# Altium integrated library WCAP-ATG8_rev15a.intlib: 195 symbols (part 1 of 2) (continued)
## WCAP-ATG8 10x12.5x5x0.6 860010375015
designator C?, comment 680 μF
WCAP-ATG8 Aluminum Electrolytic Capacitors , 680 μF; + / - 20%; 16 V , 10 x 12,5; Manufacturer: Wurth Elektronik; partNo: 860010375015; E-mail: libraries@we-online.com; Characteristics: Aluminum Electrolytic Capacitor; Recommended soldering: Wave; Operating temperature:–40 °C to +85 °C for UR < 400 V; 25 °C to +85 °C for UR ≥ 400 V; Wide capacitance value range; Load life: 2000 h @ +85 °C; ComponentLink1Description: Manufacturer; ComponentLink1URL: http://www.we-online.com; ComponentLink2Description: Datasheet; ComponentLink2URL: http://katalog.we-online.de/pbs/datasheet/860010375015.pdf; Created by: Karrer Zheng; Created Date: 6/8/2015; Capacitance: 680 μF; Application: Medium and high voltage type range from 160V-450V used as primary side input filter in power supply; Low voltage type used as energy storage or low frequency filtering in circuit, applied to general switching power supply, AC-DC converter, adapter, charger, TV, VCR, DC motor circuit filter, digital audio, digital cameras, digital video cameras, satellite receiver etc.
footprint WCAP-ATG8 10x12.5x5x0.6
pins: 1, 2

## WCAP-ATG8 10x16x5x0.6 860010375016
designator C?, comment 820 μF
WCAP-ATG8 Aluminum Electrolytic Capacitors , 820 μF; + / - 20%; 16 V , 10 x 16; Manufacturer: Wurth Elektronik; partNo: 860010375016; E-mail: libraries@we-online.com; Characteristics: Aluminum Electrolytic Capacitor; Recommended soldering: Wave; Operating temperature:–40 °C to +85 °C for UR < 400 V; 25 °C to +85 °C for UR ≥ 400 V; Wide capacitance value range; Load life: 2000 h @ +85 °C; ComponentLink1Description: Manufacturer; ComponentLink1URL: http://www.we-online.com; ComponentLink2Description: Datasheet; ComponentLink2URL: http://katalog.we-online.de/pbs/datasheet/860010375016.pdf; Created by: Karrer Zheng; Created Date: 6/8/2015; Capacitance: 820 μF; Application: Medium and high voltage type range from 160V-450V used as primary side input filter in power supply; Low voltage type used as energy storage or low frequency filtering in circuit, applied to general switching power supply, AC-DC converter, adapter, charger, TV, VCR, DC motor circuit filter, digital audio, digital cameras, digital video cameras, satellite receiver etc.
footprint WCAP-ATG8 10x16x5x0.6
pins: 1, 2

## WCAP-ATG8 10x16x5x0.6 860010375017
designator C?, comment 1000 μF
WCAP-ATG8 Aluminum Electrolytic Capacitors , 1000 μF; + / - 20%; 16 V , 10 x 16; Manufacturer: Wurth Elektronik; partNo: 860010375017; E-mail: libraries@we-online.com; Characteristics: Aluminum Electrolytic Capacitor; Recommended soldering: Wave; Operating temperature:–40 °C to +85 °C for UR < 400 V; 25 °C to +85 °C for UR ≥ 400 V; Wide capacitance value range; Load life: 2000 h @ +85 °C; ComponentLink1Description: Manufacturer; ComponentLink1URL: http://www.we-online.com; ComponentLink2Description: Datasheet; ComponentLink2URL: http://katalog.we-online.de/pbs/datasheet/860010375017.pdf; Created by: Karrer Zheng; Created Date: 6/8/2015; Capacitance: 1000 μF; Application: Medium and high voltage type range from 160V-450V used as primary side input filter in power supply; Low voltage type used as energy storage or low frequency filtering in circuit, applied to general switching power supply, AC-DC converter, adapter, charger, TV, VCR, DC motor circuit filter, digital audio, digital cameras, digital video cameras, satellite receiver etc.
footprint WCAP-ATG8 10x16x5x0.6
pins: 1, 2

## WCAP-ATG8 10x16x5x0.6 860010375018
designator C?, comment 1200 μF
WCAP-ATG8 Aluminum Electrolytic Capacitors , 1200 μF; + / - 20%; 16 V , 10 x 16; Manufacturer: Wurth Elektronik; partNo: 860010375018; E-mail: libraries@we-online.com; Characteristics: Aluminum Electrolytic Capacitor; Recommended soldering: Wave; Operating temperature:–40 °C to +85 °C for UR < 400 V; 25 °C to +85 °C for UR ≥ 400 V; Wide capacitance value range; Load life: 2000 h @ +85 °C; ComponentLink1Description: Manufacturer; ComponentLink1URL: http://www.we-online.com; ComponentLink2Description: Datasheet; ComponentLink2URL: http://katalog.we-online.de/pbs/datasheet/860010375018.pdf; Created by: Karrer Zheng; Created Date: 6/8/2015; Capacitance: 1200 μF; Application: Medium and high voltage type range from 160V-450V used as primary side input filter in power supply; Low voltage type used as energy storage or low frequency filtering in circuit, applied to general switching power supply, AC-DC converter, adapter, charger, TV, VCR, DC motor circuit filter, digital audio, digital cameras, digital video cameras, satellite receiver etc.
footprint WCAP-ATG8 10x16x5x0.6
pins: 1, 2

## WCAP-ATG8 10x20x5x0.6 860010375019
designator C?, comment 1500 μF
WCAP-ATG8 Aluminum Electrolytic Capacitors , 1500 μF; + / - 20%; 16 V , 10 x 20; Manufacturer: Wurth Elektronik; partNo: 860010375019; E-mail: libraries@we-online.com; Characteristics: Aluminum Electrolytic Capacitor; Recommended soldering: Wave; Operating temperature:–40 °C to +85 °C for UR < 400 V; 25 °C to +85 °C for UR ≥ 400 V; Wide capacitance value range; Load life: 2000 h @ +85 °C; ComponentLink1Description: Manufacturer; ComponentLink1URL: http://www.we-online.com; ComponentLink2Description: Datasheet; ComponentLink2URL: http://katalog.we-online.de/pbs/datasheet/860010375019.pdf; Created by: Karrer Zheng; Created Date: 6/8/2015; Capacitance: 1500 μF; Application: Medium and high voltage type range from 160V-450V used as primary side input filter in power supply; Low voltage type used as energy storage or low frequency filtering in circuit, applied to general switching power supply, AC-DC converter, adapter, charger, TV, VCR, DC motor circuit filter, digital audio, digital cameras, digital video cameras, satellite receiver etc.
footprint WCAP-ATG8 10x20x5x0.6
pins: 1, 2

## WCAP-ATG8 13x20x5x0.6 860010378020
designator C?, comment 1800 μF
WCAP-ATG8 Aluminum Electrolytic Capacitors , 1800 μF; + / - 20%; 16 V , 13 x 20; Manufacturer: Wurth Elektronik; partNo: 860010378020; E-mail: libraries@we-online.com; Characteristics: Aluminum Electrolytic Capacitor; Recommended soldering: Wave; Operating temperature:–40 °C to +85 °C for UR < 400 V; 25 °C to +85 °C for UR ≥ 400 V; Wide capacitance value range; Load life: 2000 h @ +85 °C; ComponentLink1Description: Manufacturer; ComponentLink1URL: http://www.we-online.com; ComponentLink2Description: Datasheet; ComponentLink2URL: http://katalog.we-online.de/pbs/datasheet/860010378020.pdf; Created by: Karrer Zheng; Created Date: 6/8/2015; Capacitance: 1800 μF; Application: Medium and high voltage type range from 160V-450V used as primary side input filter in power supply; Low voltage type used as energy storage or low frequency filtering in circuit, applied to general switching power supply, AC-DC converter, adapter, charger, TV, VCR, DC motor circuit filter, digital audio, digital cameras, digital video cameras, satellite receiver etc.
footprint WCAP-ATG8 13x20x5x0.6
pins: 1, 2

## WCAP-ATG8 13x20x5x0.6 860010378021
designator C?, comment 2200 μF
WCAP-ATG8 Aluminum Electrolytic Capacitors , 2200 μF; + / - 20%; 16 V , 13 x 20; Manufacturer: Wurth Elektronik; partNo: 860010378021; E-mail: libraries@we-online.com; Characteristics: Aluminum Electrolytic Capacitor; Recommended soldering: Wave; Operating temperature:–40 °C to +85 °C for UR < 400 V; 25 °C to +85 °C for UR ≥ 400 V; Wide capacitance value range; Load life: 2000 h @ +85 °C; ComponentLink1Description: Manufacturer; ComponentLink1URL: http://www.we-online.com; ComponentLink2Description: Datasheet; ComponentLink2URL: http://katalog.we-online.de/pbs/datasheet/860010378021.pdf; Created by: Karrer Zheng; Created Date: 6/8/2015; Capacitance: 2200 μF; Application: Medium and high voltage type range from 160V-450V used as primary side input filter in power supply; Low voltage type used as energy storage or low frequency filtering in circuit, applied to general switching power supply, AC-DC converter, adapter, charger, TV, VCR, DC motor circuit filter, digital audio, digital cameras, digital video cameras, satellite receiver etc.
footprint WCAP-ATG8 13x20x5x0.6
pins: 1, 2

## WCAP-ATG8 13x20x5x0.6 860010378022
designator C?, comment 2700 μF
WCAP-ATG8 Aluminum Electrolytic Capacitors , 2700 μF; + / - 20%; 16 V , 13 x 20; Manufacturer: Wurth Elektronik; partNo: 860010378022; E-mail: libraries@we-online.com; Characteristics: Aluminum Electrolytic Capacitor; Recommended soldering: Wave; Operating temperature:–40 °C to +85 °C for UR < 400 V; 25 °C to +85 °C for UR ≥ 400 V; Wide capacitance value range; Load life: 2000 h @ +85 °C; ComponentLink1Description: Manufacturer; ComponentLink1URL: http://www.we-online.com; ComponentLink2Description: Datasheet; ComponentLink2URL: http://katalog.we-online.de/pbs/datasheet/860010378022.pdf; Created by: Karrer Zheng; Created Date: 6/8/2015; Capacitance: 2700 μF; Application: Medium and high voltage type range from 160V-450V used as primary side input filter in power supply; Low voltage type used as energy storage or low frequency filtering in circuit, applied to general switching power supply, AC-DC converter, adapter, charger, TV, VCR, DC motor circuit filter, digital audio, digital cameras, digital video cameras, satellite receiver etc.
footprint WCAP-ATG8 13x20x5x0.6
pins: 1, 2

## WCAP-ATG8 13x20x5x0.6 860010378023
designator C?, comment 3300 μF
WCAP-ATG8 Aluminum Electrolytic Capacitors , 3300 μF; + / - 20%; 16 V , 13 x 20; Manufacturer: Wurth Elektronik; partNo: 860010378023; E-mail: libraries@we-online.com; Characteristics: Aluminum Electrolytic Capacitor; Recommended soldering: Wave; Operating temperature:–40 °C to +85 °C for UR < 400 V; 25 °C to +85 °C for UR ≥ 400 V; Wide capacitance value range; Load life: 2000 h @ +85 °C; ComponentLink1Description: Manufacturer; ComponentLink1URL: http://www.we-online.com; ComponentLink2Description: Datasheet; ComponentLink2URL: http://katalog.we-online.de/pbs/datasheet/860010378023.pdf; Created by: Karrer Zheng; Created Date: 6/8/2015; Capacitance: 3300 μF; Application: Medium and high voltage type range from 160V-450V used as primary side input filter in power supply; Low voltage type used as energy storage or low frequency filtering in circuit, applied to general switching power supply, AC-DC converter, adapter, charger, TV, VCR, DC motor circuit filter, digital audio, digital cameras, digital video cameras, satellite receiver etc.
footprint WCAP-ATG8 13x20x5x0.6
pins: 1, 2

## WCAP-ATG8 16x25x7.5x0.8 860010380024
designator C?, comment 3900 μF
WCAP-ATG8 Aluminum Electrolytic Capacitors , 3900 μF; + / - 20%; 16 V , 16 x 25; Manufacturer: Wurth Elektronik; partNo: 860010380024; E-mail: libraries@we-online.com; Characteristics: Aluminum Electrolytic Capacitor; Recommended soldering: Wave; Operating temperature:–40 °C to +85 °C for UR < 400 V; 25 °C to +85 °C for UR ≥ 400 V; Wide capacitance value range; Load life: 2000 h @ +85 °C; ComponentLink1Description: Manufacturer; ComponentLink1URL: http://www.we-online.com; ComponentLink2Description: Datasheet; ComponentLink2URL: http://katalog.we-online.de/pbs/datasheet/860010380024.pdf; Created by: Karrer Zheng; Created Date: 6/8/2015; Capacitance: 3900 μF; Application: Medium and high voltage type range from 160V-450V used as primary side input filter in power supply; Low voltage type used as energy storage or low frequency filtering in circuit, applied to general switching power supply, AC-DC converter, adapter, charger, TV, VCR, DC motor circuit filter, digital audio, digital cameras, digital video cameras, satellite receiver etc.
footprint WCAP-ATG8 16x25x7.5x0.8
pins: 1, 2

## WCAP-ATG8 16x25x7.5x0.8 860010380025
designator C?, comment 4700 μF
WCAP-ATG8 Aluminum Electrolytic Capacitors , 4700 μF; + / - 20%; 16 V , 16 x 25; Manufacturer: Wurth Elektronik; partNo: 860010380025; E-mail: libraries@we-online.com; Characteristics: Aluminum Electrolytic Capacitor; Recommended soldering: Wave; Operating temperature:–40 °C to +85 °C for UR < 400 V; 25 °C to +85 °C for UR ≥ 400 V; Wide capacitance value range; Load life: 2000 h @ +85 °C; ComponentLink1Description: Manufacturer; ComponentLink1URL: http://www.we-online.com; ComponentLink2Description: Datasheet; ComponentLink2URL: http://katalog.we-online.de/pbs/datasheet/860010380025.pdf; Created by: Karrer Zheng; Created Date: 6/8/2015; Capacitance: 4700 μF; Application: Medium and high voltage type range from 160V-450V used as primary side input filter in power supply; Low voltage type used as energy storage or low frequency filtering in circuit, applied to general switching power supply, AC-DC converter, adapter, charger, TV, VCR, DC motor circuit filter, digital audio, digital cameras, digital video cameras, satellite receiver etc.
footprint WCAP-ATG8 16x25x7.5x0.8
pins: 1, 2

## WCAP-ATG8 16x31.5x7.5x0.8 860010380026
designator C?, comment 5600 μF
WCAP-ATG8 Aluminum Electrolytic Capacitors , 5600 μF; + / - 20%; 16 V , 16 x 31,5; Manufacturer: Wurth Elektronik; partNo: 860010380026; E-mail: libraries@we-online.com; Characteristics: Aluminum Electrolytic Capacitor; Recommended soldering: Wave; Operating temperature:–40 °C to +85 °C for UR < 400 V; 25 °C to +85 °C for UR ≥ 400 V; Wide capacitance value range; Load life: 2000 h @ +85 °C; ComponentLink1Description: Manufacturer; ComponentLink1URL: http://www.we-online.com; ComponentLink2Description: Datasheet; ComponentLink2URL: http://katalog.we-online.de/pbs/datasheet/860010380026.pdf; Created by: Karrer Zheng; Created Date: 6/8/2015; Capacitance: 5600 μF; Application: Medium and high voltage type range from 160V-450V used as primary side input filter in power supply; Low voltage type used as energy storage or low frequency filtering in circuit, applied to general switching power supply, AC-DC converter, adapter, charger, TV, VCR, DC motor circuit filter, digital audio, digital cameras, digital video cameras, satellite receiver etc.
footprint WCAP-ATG8 16x31.5x7.5x0.8
pins: 1, 2

## WCAP-ATG8 16x31.5x7.5x0.8 860010380027
designator C?, comment 6800 μF
WCAP-ATG8 Aluminum Electrolytic Capacitors , 6800 μF; + / - 20%; 16 V , 16 x 31,5; Manufacturer: Wurth Elektronik; partNo: 860010380027; E-mail: libraries@we-online.com; Characteristics: Aluminum Electrolytic Capacitor; Recommended soldering: Wave; Operating temperature:–40 °C to +85 °C for UR < 400 V; 25 °C to +85 °C for UR ≥ 400 V; Wide capacitance value range; Load life: 2000 h @ +85 °C; ComponentLink1Description: Manufacturer; ComponentLink1URL: http://www.we-online.com; ComponentLink2Description: Datasheet; ComponentLink2URL: http://katalog.we-online.de/pbs/datasheet/860010380027.pdf; Created by: Karrer Zheng; Created Date: 6/8/2015; Capacitance: 6800 μF; Application: Medium and high voltage type range from 160V-450V used as primary side input filter in power supply; Low voltage type used as energy storage or low frequency filtering in circuit, applied to general switching power supply, AC-DC converter, adapter, charger, TV, VCR, DC motor circuit filter, digital audio, digital cameras, digital video cameras, satellite receiver etc.
footprint WCAP-ATG8 16x31.5x7.5x0.8
pins: 1, 2

## WCAP-ATG8 16x35.5x7.5x0.8 860010380028
designator C?, comment 8200 μF
WCAP-ATG8 Aluminum Electrolytic Capacitors , 8200 μF; + / - 20%; 16 V , 16 x 35,5; Manufacturer: Wurth Elektronik; partNo: 860010380028; E-mail: libraries@we-online.com; Characteristics: Aluminum Electrolytic Capacitor; Recommended soldering: Wave; Operating temperature:–40 °C to +85 °C for UR < 400 V; 25 °C to +85 °C for UR ≥ 400 V; Wide capacitance value range; Load life: 2000 h @ +85 °C; ComponentLink1Description: Manufacturer; ComponentLink1URL: http://www.we-online.com; ComponentLink2Description: Datasheet; ComponentLink2URL: http://katalog.we-online.de/pbs/datasheet/860010380028.pdf; Created by: Karrer Zheng; Created Date: 6/8/2015; Capacitance: 8200 μF; Application: Medium and high voltage type range from 160V-450V used as primary side input filter in power supply; Low voltage type used as energy storage or low frequency filtering in circuit, applied to general switching power supply, AC-DC converter, adapter, charger, TV, VCR, DC motor circuit filter, digital audio, digital cameras, digital video cameras, satellite receiver etc.
footprint WCAP-ATG8 16x35.5x7.5x0.8
pins: 1, 2

## WCAP-ATG8 18x35.5x7.5x0.8 860010381029
designator C?, comment 10000 μF
WCAP-ATG8 Aluminum Electrolytic Capacitors , 10000 μF; + / - 20%; 16 V , 18 x 35,5; Manufacturer: Wurth Elektronik; partNo: 860010381029; E-mail: libraries@we-online.com; Characteristics: Aluminum Electrolytic Capacitor; Recommended soldering: Wave; Operating temperature:–40 °C to +85 °C for UR < 400 V; 25 °C to +85 °C for UR ≥ 400 V; Wide capacitance value range; Load life: 2000 h @ +85 °C; ComponentLink1Description: Manufacturer; ComponentLink1URL: http://www.we-online.com; ComponentLink2Description: Datasheet; ComponentLink2URL: http://katalog.we-online.de/pbs/datasheet/860010381029.pdf; Created by: Karrer Zheng; Created Date: 6/8/2015; Capacitance: 10000 μF; Application: Medium and high voltage type range from 160V-450V used as primary side input filter in power supply; Low voltage type used as energy storage or low frequency filtering in circuit, applied to general switching power supply, AC-DC converter, adapter, charger, TV, VCR, DC motor circuit filter, digital audio, digital cameras, digital video cameras, satellite receiver etc.
footprint WCAP-ATG8 18x35.5x7.5x0.8
pins: 1, 2

## WCAP-ATG8 18x35.5x7.5x0.8 860010381030
designator C?, comment 12000 μF
WCAP-ATG8 Aluminum Electrolytic Capacitors , 12000 μF; + / - 20%; 16 V , 18 x 35,5; Manufacturer: Wurth Elektronik; partNo: 860010381030; E-mail: libraries@we-online.com; Characteristics: Aluminum Electrolytic Capacitor; Recommended soldering: Wave; Operating temperature:–40 °C to +85 °C for UR < 400 V; 25 °C to +85 °C for UR ≥ 400 V; Wide capacitance value range; Load life: 2000 h @ +85 °C; ComponentLink1Description: Manufacturer; ComponentLink1URL: http://www.we-online.com; ComponentLink2Description: Datasheet; ComponentLink2URL: http://katalog.we-online.de/pbs/datasheet/860010381030.pdf; Created by: Karrer Zheng; Created Date: 6/8/2015; Capacitance: 12000 μF; Application: Medium and high voltage type range from 160V-450V used as primary side input filter in power supply; Low voltage type used as energy storage or low frequency filtering in circuit, applied to general switching power supply, AC-DC converter, adapter, charger, TV, VCR, DC motor circuit filter, digital audio, digital cameras, digital video cameras, satellite receiver etc.
footprint WCAP-ATG8 18x35.5x7.5x0.8
pins: 1, 2

## WCAP-ATG8 22x41x10x0.8 860010383031
designator C?, comment 15000 μF
WCAP-ATG8 Aluminum Electrolytic Capacitors , 15000 μF; + / - 20%; 16 V , 22 x 41; Manufacturer: Wurth Elektronik; partNo: 860010383031; E-mail: libraries@we-online.com; Characteristics: Aluminum Electrolytic Capacitor; Recommended soldering: Wave; Operating temperature:–40 °C to +85 °C for UR < 400 V; 25 °C to +85 °C for UR ≥ 400 V; Wide capacitance value range; Load life: 2000 h @ +85 °C; ComponentLink1Description: Manufacturer; ComponentLink1URL: http://www.we-online.com; ComponentLink2Description: Datasheet; ComponentLink2URL: http://katalog.we-online.de/pbs/datasheet/860010383031.pdf; Created by: Karrer Zheng; Created Date: 6/8/2015; Capacitance: 15000 μF; Application: Medium and high voltage type range from 160V-450V used as primary side input filter in power supply; Low voltage type used as energy storage or low frequency filtering in circuit, applied to general switching power supply, AC-DC converter, adapter, charger, TV, VCR, DC motor circuit filter, digital audio, digital cameras, digital video cameras, satellite receiver etc.
footprint WCAP-ATG8 22x41x10x0.8
pins: 1, 2


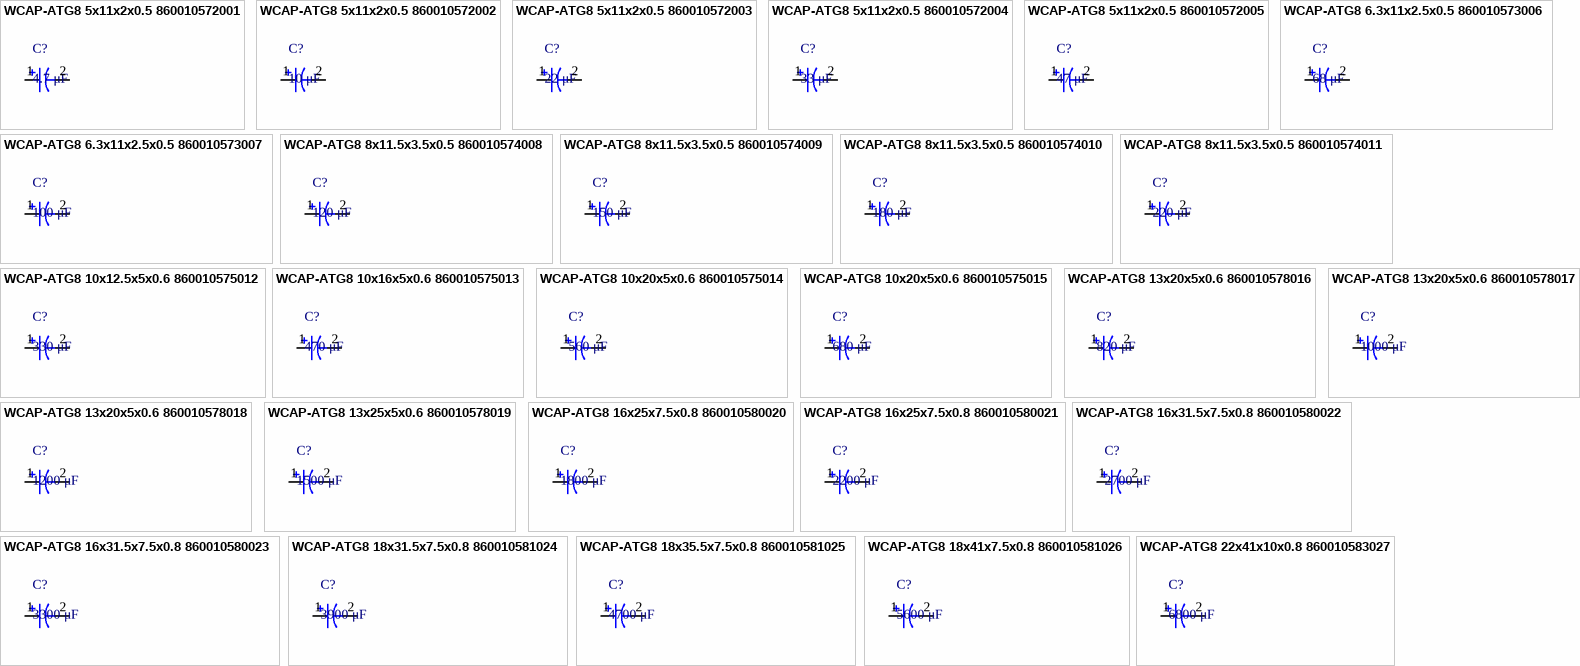
[diagram p2: symbols WCAP-ATG8 5x11x2x0.5 860010572001 to WCAP-ATG8 22x41x10x0.8 860010583027]

## WCAP-ATG8 5x11x2x0.5 860010572001
designator C?, comment 4.7 μF
WCAP-ATG8 Aluminum Electrolytic Capacitors , 4,7 μF; + / - 20%; 35 V , 5 x 11; Manufacturer: Wurth Elektronik; partNo: 860010572001; E-mail: libraries@we-online.com; Characteristics: Aluminum Electrolytic Capacitor; Recommended soldering: Wave; Operating temperature:–40 °C to +85 °C for UR < 400 V; 25 °C to +85 °C for UR ≥ 400 V; Wide capacitance value range; Load life: 2000 h @ +85 °C; ComponentLink1Description: Manufacturer; ComponentLink1URL: http://www.we-online.com; ComponentLink2Description: Datasheet; ComponentLink2URL: http://katalog.we-online.de/pbs/datasheet/860010572001.pdf; Created by: Karrer Zheng; Created Date: 6/8/2015; Capacitance: 4.7 μF; Application: Medium and high voltage type range from 160V-450V used as primary side input filter in power supply; Low voltage type used as energy storage or low frequency filtering in circuit, applied to general switching power supply, AC-DC converter, adapter, charger, TV, VCR, DC motor circuit filter, digital audio, digital cameras, digital video cameras, satellite receiver etc.
footprint WCAP-ATG8 5x11x2x0.5
pins: 1, 2

## WCAP-ATG8 5x11x2x0.5 860010572002
designator C?, comment 10 μF
WCAP-ATG8 Aluminum Electrolytic Capacitors , 10 μF; + / - 20%; 35 V , 5 x 11; Manufacturer: Wurth Elektronik; partNo: 860010572002; E-mail: libraries@we-online.com; Characteristics: Aluminum Electrolytic Capacitor; Recommended soldering: Wave; Operating temperature:–40 °C to +85 °C for UR < 400 V; 25 °C to +85 °C for UR ≥ 400 V; Wide capacitance value range; Load life: 2000 h @ +85 °C; ComponentLink1Description: Manufacturer; ComponentLink1URL: http://www.we-online.com; ComponentLink2Description: Datasheet; ComponentLink2URL: http://katalog.we-online.de/pbs/datasheet/860010572002.pdf; Created by: Karrer Zheng; Created Date: 6/8/2015; Capacitance: 10 μF; Application: Medium and high voltage type range from 160V-450V used as primary side input filter in power supply; Low voltage type used as energy storage or low frequency filtering in circuit, applied to general switching power supply, AC-DC converter, adapter, charger, TV, VCR, DC motor circuit filter, digital audio, digital cameras, digital video cameras, satellite receiver etc.
footprint WCAP-ATG8 5x11x2x0.5
pins: 1, 2

## WCAP-ATG8 5x11x2x0.5 860010572003
designator C?, comment 22 μF
WCAP-ATG8 Aluminum Electrolytic Capacitors , 22 μF; + / - 20%; 35 V , 5 x 11; Manufacturer: Wurth Elektronik; partNo: 860010572003; E-mail: libraries@we-online.com; Characteristics: Aluminum Electrolytic Capacitor; Recommended soldering: Wave; Operating temperature:–40 °C to +85 °C for UR < 400 V; 25 °C to +85 °C for UR ≥ 400 V; Wide capacitance value range; Load life: 2000 h @ +85 °C; ComponentLink1Description: Manufacturer; ComponentLink1URL: http://www.we-online.com; ComponentLink2Description: Datasheet; ComponentLink2URL: http://katalog.we-online.de/pbs/datasheet/860010572003.pdf; Created by: Karrer Zheng; Created Date: 6/8/2015; Capacitance: 22 μF; Application: Medium and high voltage type range from 160V-450V used as primary side input filter in power supply; Low voltage type used as energy storage or low frequency filtering in circuit, applied to general switching power supply, AC-DC converter, adapter, charger, TV, VCR, DC motor circuit filter, digital audio, digital cameras, digital video cameras, satellite receiver etc.
footprint WCAP-ATG8 5x11x2x0.5
pins: 1, 2

## WCAP-ATG8 5x11x2x0.5 860010572004
designator C?, comment 33 μF
WCAP-ATG8 Aluminum Electrolytic Capacitors , 33 μF; + / - 20%; 35 V , 5 x 11; Manufacturer: Wurth Elektronik; partNo: 860010572004; E-mail: libraries@we-online.com; Characteristics: Aluminum Electrolytic Capacitor; Recommended soldering: Wave; Operating temperature:–40 °C to +85 °C for UR < 400 V; 25 °C to +85 °C for UR ≥ 400 V; Wide capacitance value range; Load life: 2000 h @ +85 °C; ComponentLink1Description: Manufacturer; ComponentLink1URL: http://www.we-online.com; ComponentLink2Description: Datasheet; ComponentLink2URL: http://katalog.we-online.de/pbs/datasheet/860010572004.pdf; Created by: Karrer Zheng; Created Date: 6/8/2015; Capacitance: 33 μF; Application: Medium and high voltage type range from 160V-450V used as primary side input filter in power supply; Low voltage type used as energy storage or low frequency filtering in circuit, applied to general switching power supply, AC-DC converter, adapter, charger, TV, VCR, DC motor circuit filter, digital audio, digital cameras, digital video cameras, satellite receiver etc.
footprint WCAP-ATG8 5x11x2x0.5
pins: 1, 2

## WCAP-ATG8 5x11x2x0.5 860010572005
designator C?, comment 47 μF
WCAP-ATG8 Aluminum Electrolytic Capacitors , 47 μF; + / - 20%; 35 V , 5 x 11; Manufacturer: Wurth Elektronik; partNo: 860010572005; E-mail: libraries@we-online.com; Characteristics: Aluminum Electrolytic Capacitor; Recommended soldering: Wave; Operating temperature:–40 °C to +85 °C for UR < 400 V; 25 °C to +85 °C for UR ≥ 400 V; Wide capacitance value range; Load life: 2000 h @ +85 °C; ComponentLink1Description: Manufacturer; ComponentLink1URL: http://www.we-online.com; ComponentLink2Description: Datasheet; ComponentLink2URL: http://katalog.we-online.de/pbs/datasheet/860010572005.pdf; Created by: Karrer Zheng; Created Date: 6/8/2015; Capacitance: 47 μF; Application: Medium and high voltage type range from 160V-450V used as primary side input filter in power supply; Low voltage type used as energy storage or low frequency filtering in circuit, applied to general switching power supply, AC-DC converter, adapter, charger, TV, VCR, DC motor circuit filter, digital audio, digital cameras, digital video cameras, satellite receiver etc.
footprint WCAP-ATG8 5x11x2x0.5
pins: 1, 2

## WCAP-ATG8 6.3x11x2.5x0.5 860010573006
designator C?, comment 68 μF
WCAP-ATG8 Aluminum Electrolytic Capacitors , 68 μF; + / - 20%; 35 V , 6,3 x 11; Manufacturer: Wurth Elektronik; partNo: 860010573006; E-mail: libraries@we-online.com; Characteristics: Aluminum Electrolytic Capacitor; Recommended soldering: Wave; Operating temperature:–40 °C to +85 °C for UR < 400 V; 25 °C to +85 °C for UR ≥ 400 V; Wide capacitance value range; Load life: 2000 h @ +85 °C; ComponentLink1Description: Manufacturer; ComponentLink1URL: http://www.we-online.com; ComponentLink2Description: Datasheet; ComponentLink2URL: http://katalog.we-online.de/pbs/datasheet/860010573006.pdf; Created by: Karrer Zheng; Created Date: 6/8/2015; Capacitance: 68 μF; Application: Medium and high voltage type range from 160V-450V used as primary side input filter in power supply; Low voltage type used as energy storage or low frequency filtering in circuit, applied to general switching power supply, AC-DC converter, adapter, charger, TV, VCR, DC motor circuit filter, digital audio, digital cameras, digital video cameras, satellite receiver etc.
footprint WCAP-ATG8 6.3x11x2.5x0.5
pins: 1, 2

## WCAP-ATG8 6.3x11x2.5x0.5 860010573007
designator C?, comment 100 μF
WCAP-ATG8 Aluminum Electrolytic Capacitors , 100 μF; + / - 20%; 35 V , 6,3 x 11; Manufacturer: Wurth Elektronik; partNo: 860010573007; E-mail: libraries@we-online.com; Characteristics: Aluminum Electrolytic Capacitor; Recommended soldering: Wave; Operating temperature:–40 °C to +85 °C for UR < 400 V; 25 °C to +85 °C for UR ≥ 400 V; Wide capacitance value range; Load life: 2000 h @ +85 °C; ComponentLink1Description: Manufacturer; ComponentLink1URL: http://www.we-online.com; ComponentLink2Description: Datasheet; ComponentLink2URL: http://katalog.we-online.de/pbs/datasheet/860010573007.pdf; Created by: Karrer Zheng; Created Date: 6/8/2015; Capacitance: 100 μF; Application: Medium and high voltage type range from 160V-450V used as primary side input filter in power supply; Low voltage type used as energy storage or low frequency filtering in circuit, applied to general switching power supply, AC-DC converter, adapter, charger, TV, VCR, DC motor circuit filter, digital audio, digital cameras, digital video cameras, satellite receiver etc.
footprint WCAP-ATG8 6.3x11x2.5x0.5
pins: 1, 2

## WCAP-ATG8 8x11.5x3.5x0.5 860010574008
designator C?, comment 120 μF
WCAP-ATG8 Aluminum Electrolytic Capacitors , 120 μF; + / - 20%; 35 V , 8 x 11,5; Manufacturer: Wurth Elektronik; partNo: 860010574008; E-mail: libraries@we-online.com; Characteristics: Aluminum Electrolytic Capacitor; Recommended soldering: Wave; Operating temperature:–40 °C to +85 °C for UR < 400 V; 25 °C to +85 °C for UR ≥ 400 V; Wide capacitance value range; Load life: 2000 h @ +85 °C; ComponentLink1Description: Manufacturer; ComponentLink1URL: http://www.we-online.com; ComponentLink2Description: Datasheet; ComponentLink2URL: http://katalog.we-online.de/pbs/datasheet/860010574008.pdf; Created by: Karrer Zheng; Created Date: 6/8/2015; Capacitance: 120 μF; Application: Medium and high voltage type range from 160V-450V used as primary side input filter in power supply; Low voltage type used as energy storage or low frequency filtering in circuit, applied to general switching power supply, AC-DC converter, adapter, charger, TV, VCR, DC motor circuit filter, digital audio, digital cameras, digital video cameras, satellite receiver etc.
footprint WCAP-ATG8 8x11.5x3.5x0.5
pins: 1, 2

## WCAP-ATG8 8x11.5x3.5x0.5 860010574009
designator C?, comment 150 μF
WCAP-ATG8 Aluminum Electrolytic Capacitors , 150 μF; + / - 20%; 35 V , 8 x 11,5; Manufacturer: Wurth Elektronik; partNo: 860010574009; E-mail: libraries@we-online.com; Characteristics: Aluminum Electrolytic Capacitor; Recommended soldering: Wave; Operating temperature:–40 °C to +85 °C for UR < 400 V; 25 °C to +85 °C for UR ≥ 400 V; Wide capacitance value range; Load life: 2000 h @ +85 °C; ComponentLink1Description: Manufacturer; ComponentLink1URL: http://www.we-online.com; ComponentLink2Description: Datasheet; ComponentLink2URL: http://katalog.we-online.de/pbs/datasheet/860010574009.pdf; Created by: Karrer Zheng; Created Date: 6/8/2015; Capacitance: 150 μF; Application: Medium and high voltage type range from 160V-450V used as primary side input filter in power supply; Low voltage type used as energy storage or low frequency filtering in circuit, applied to general switching power supply, AC-DC converter, adapter, charger, TV, VCR, DC motor circuit filter, digital audio, digital cameras, digital video cameras, satellite receiver etc.
footprint WCAP-ATG8 8x11.5x3.5x0.5
pins: 1, 2

## WCAP-ATG8 8x11.5x3.5x0.5 860010574010
designator C?, comment 180 μF
WCAP-ATG8 Aluminum Electrolytic Capacitors , 180 μF; + / - 20%; 35 V , 8 x 11,5; Manufacturer: Wurth Elektronik; partNo: 860010574010; E-mail: libraries@we-online.com; Characteristics: Aluminum Electrolytic Capacitor; Recommended soldering: Wave; Operating temperature:–40 °C to +85 °C for UR < 400 V; 25 °C to +85 °C for UR ≥ 400 V; Wide capacitance value range; Load life: 2000 h @ +85 °C; ComponentLink1Description: Manufacturer; ComponentLink1URL: http://www.we-online.com; ComponentLink2Description: Datasheet; ComponentLink2URL: http://katalog.we-online.de/pbs/datasheet/860010574010.pdf; Created by: Karrer Zheng; Created Date: 6/8/2015; Capacitance: 180 μF; Application: Medium and high voltage type range from 160V-450V used as primary side input filter in power supply; Low voltage type used as energy storage or low frequency filtering in circuit, applied to general switching power supply, AC-DC converter, adapter, charger, TV, VCR, DC motor circuit filter, digital audio, digital cameras, digital video cameras, satellite receiver etc.
footprint WCAP-ATG8 8x11.5x3.5x0.5
pins: 1, 2

## WCAP-ATG8 8x11.5x3.5x0.5 860010574011
designator C?, comment 220 μF
WCAP-ATG8 Aluminum Electrolytic Capacitors , 220 μF; + / - 20%; 35 V , 8 x 11,5; Manufacturer: Wurth Elektronik; partNo: 860010574011; E-mail: libraries@we-online.com; Characteristics: Aluminum Electrolytic Capacitor; Recommended soldering: Wave; Operating temperature:–40 °C to +85 °C for UR < 400 V; 25 °C to +85 °C for UR ≥ 400 V; Wide capacitance value range; Load life: 2000 h @ +85 °C; ComponentLink1Description: Manufacturer; ComponentLink1URL: http://www.we-online.com; ComponentLink2Description: Datasheet; ComponentLink2URL: http://katalog.we-online.de/pbs/datasheet/860010574011.pdf; Created by: Karrer Zheng; Created Date: 6/8/2015; Capacitance: 220 μF; Application: Medium and high voltage type range from 160V-450V used as primary side input filter in power supply; Low voltage type used as energy storage or low frequency filtering in circuit, applied to general switching power supply, AC-DC converter, adapter, charger, TV, VCR, DC motor circuit filter, digital audio, digital cameras, digital video cameras, satellite receiver etc.
footprint WCAP-ATG8 8x11.5x3.5x0.5
pins: 1, 2

## WCAP-ATG8 10x12.5x5x0.6 860010575012
designator C?, comment 330 μF
WCAP-ATG8 Aluminum Electrolytic Capacitors , 330 μF; + / - 20%; 35 V , 10 x 12,5; Manufacturer: Wurth Elektronik; partNo: 860010575012; E-mail: libraries@we-online.com; Characteristics: Aluminum Electrolytic Capacitor; Recommended soldering: Wave; Operating temperature:–40 °C to +85 °C for UR < 400 V; 25 °C to +85 °C for UR ≥ 400 V; Wide capacitance value range; Load life: 2000 h @ +85 °C; ComponentLink1Description: Manufacturer; ComponentLink1URL: http://www.we-online.com; ComponentLink2Description: Datasheet; ComponentLink2URL: http://katalog.we-online.de/pbs/datasheet/860010575012.pdf; Created by: Karrer Zheng; Created Date: 6/8/2015; Capacitance: 330 μF; Application: Medium and high voltage type range from 160V-450V used as primary side input filter in power supply; Low voltage type used as energy storage or low frequency filtering in circuit, applied to general switching power supply, AC-DC converter, adapter, charger, TV, VCR, DC motor circuit filter, digital audio, digital cameras, digital video cameras, satellite receiver etc.
footprint WCAP-ATG8 10x12.5x5x0.6
pins: 1, 2

## WCAP-ATG8 10x16x5x0.6 860010575013
designator C?, comment 470 μF
WCAP-ATG8 Aluminum Electrolytic Capacitors , 470 μF; + / - 20%; 35 V , 10 x 16; Manufacturer: Wurth Elektronik; partNo: 860010575013; E-mail: libraries@we-online.com; Characteristics: Aluminum Electrolytic Capacitor; Recommended soldering: Wave; Operating temperature:–40 °C to +85 °C for UR < 400 V; 25 °C to +85 °C for UR ≥ 400 V; Wide capacitance value range; Load life: 2000 h @ +85 °C; ComponentLink1Description: Manufacturer; ComponentLink1URL: http://www.we-online.com; ComponentLink2Description: Datasheet; ComponentLink2URL: http://katalog.we-online.de/pbs/datasheet/860010575013.pdf; Created by: Karrer Zheng; Created Date: 6/8/2015; Capacitance: 470 μF; Application: Medium and high voltage type range from 160V-450V used as primary side input filter in power supply; Low voltage type used as energy storage or low frequency filtering in circuit, applied to general switching power supply, AC-DC converter, adapter, charger, TV, VCR, DC motor circuit filter, digital audio, digital cameras, digital video cameras, satellite receiver etc.
footprint WCAP-ATG8 10x16x5x0.6
pins: 1, 2

## WCAP-ATG8 10x20x5x0.6 860010575014
designator C?, comment 560 μF
WCAP-ATG8 Aluminum Electrolytic Capacitors , 560 μF; + / - 20%; 35 V , 10 x 20; Manufacturer: Wurth Elektronik; partNo: 860010575014; E-mail: libraries@we-online.com; Characteristics: Aluminum Electrolytic Capacitor; Recommended soldering: Wave; Operating temperature:–40 °C to +85 °C for UR < 400 V; 25 °C to +85 °C for UR ≥ 400 V; Wide capacitance value range; Load life: 2000 h @ +85 °C; ComponentLink1Description: Manufacturer; ComponentLink1URL: http://www.we-online.com; ComponentLink2Description: Datasheet; ComponentLink2URL: http://katalog.we-online.de/pbs/datasheet/860010575014.pdf; Created by: Karrer Zheng; Created Date: 6/8/2015; Capacitance: 560 μF; Application: Medium and high voltage type range from 160V-450V used as primary side input filter in power supply; Low voltage type used as energy storage or low frequency filtering in circuit, applied to general switching power supply, AC-DC converter, adapter, charger, TV, VCR, DC motor circuit filter, digital audio, digital cameras, digital video cameras, satellite receiver etc.
footprint WCAP-ATG8 10x20x5x0.6
pins: 1, 2

## WCAP-ATG8 10x20x5x0.6 860010575015
designator C?, comment 680 μF
WCAP-ATG8 Aluminum Electrolytic Capacitors , 680 μF; + / - 20%; 35 V , 10 x 20; Manufacturer: Wurth Elektronik; partNo: 860010575015; E-mail: libraries@we-online.com; Characteristics: Aluminum Electrolytic Capacitor; Recommended soldering: Wave; Operating temperature:–40 °C to +85 °C for UR < 400 V; 25 °C to +85 °C for UR ≥ 400 V; Wide capacitance value range; Load life: 2000 h @ +85 °C; ComponentLink1Description: Manufacturer; ComponentLink1URL: http://www.we-online.com; ComponentLink2Description: Datasheet; ComponentLink2URL: http://katalog.we-online.de/pbs/datasheet/860010575015.pdf; Created by: Karrer Zheng; Created Date: 6/8/2015; Capacitance: 680 μF; Application: Medium and high voltage type range from 160V-450V used as primary side input filter in power supply; Low voltage type used as energy storage or low frequency filtering in circuit, applied to general switching power supply, AC-DC converter, adapter, charger, TV, VCR, DC motor circuit filter, digital audio, digital cameras, digital video cameras, satellite receiver etc.
footprint WCAP-ATG8 10x20x5x0.6
pins: 1, 2

## WCAP-ATG8 13x20x5x0.6 860010578016
designator C?, comment 820 μF
WCAP-ATG8 Aluminum Electrolytic Capacitors , 820 μF; + / - 20%; 35 V , 13 x 20; Manufacturer: Wurth Elektronik; partNo: 860010578016; E-mail: libraries@we-online.com; Characteristics: Aluminum Electrolytic Capacitor; Recommended soldering: Wave; Operating temperature:–40 °C to +85 °C for UR < 400 V; 25 °C to +85 °C for UR ≥ 400 V; Wide capacitance value range; Load life: 2000 h @ +85 °C; ComponentLink1Description: Manufacturer; ComponentLink1URL: http://www.we-online.com; ComponentLink2Description: Datasheet; ComponentLink2URL: http://katalog.we-online.de/pbs/datasheet/860010578016.pdf; Created by: Karrer Zheng; Created Date: 6/8/2015; Capacitance: 820 μF; Application: Medium and high voltage type range from 160V-450V used as primary side input filter in power supply; Low voltage type used as energy storage or low frequency filtering in circuit, applied to general switching power supply, AC-DC converter, adapter, charger, TV, VCR, DC motor circuit filter, digital audio, digital cameras, digital video cameras, satellite receiver etc.
footprint WCAP-ATG8 13x20x5x0.6
pins: 1, 2

## WCAP-ATG8 13x20x5x0.6 860010578017
designator C?, comment 1000 μF
WCAP-ATG8 Aluminum Electrolytic Capacitors , 1000 μF; + / - 20%; 35 V , 13 x 20; Manufacturer: Wurth Elektronik; partNo: 860010578017; E-mail: libraries@we-online.com; Characteristics: Aluminum Electrolytic Capacitor; Recommended soldering: Wave; Operating temperature:–40 °C to +85 °C for UR < 400 V; 25 °C to +85 °C for UR ≥ 400 V; Wide capacitance value range; Load life: 2000 h @ +85 °C; ComponentLink1Description: Manufacturer; ComponentLink1URL: http://www.we-online.com; ComponentLink2Description: Datasheet; ComponentLink2URL: http://katalog.we-online.de/pbs/datasheet/860010578017.pdf; Created by: Karrer Zheng; Created Date: 6/8/2015; Capacitance: 1000 μF; Application: Medium and high voltage type range from 160V-450V used as primary side input filter in power supply; Low voltage type used as energy storage or low frequency filtering in circuit, applied to general switching power supply, AC-DC converter, adapter, charger, TV, VCR, DC motor circuit filter, digital audio, digital cameras, digital video cameras, satellite receiver etc.
footprint WCAP-ATG8 13x20x5x0.6
pins: 1, 2

## WCAP-ATG8 13x20x5x0.6 860010578018
designator C?, comment 1200 μF
WCAP-ATG8 Aluminum Electrolytic Capacitors , 1200 μF; + / - 20%; 35 V , 13 x 20; Manufacturer: Wurth Elektronik; partNo: 860010578018; E-mail: libraries@we-online.com; Characteristics: Aluminum Electrolytic Capacitor; Recommended soldering: Wave; Operating temperature:–40 °C to +85 °C for UR < 400 V; 25 °C to +85 °C for UR ≥ 400 V; Wide capacitance value range; Load life: 2000 h @ +85 °C; ComponentLink1Description: Manufacturer; ComponentLink1URL: http://www.we-online.com; ComponentLink2Description: Datasheet; ComponentLink2URL: http://katalog.we-online.de/pbs/datasheet/860010578018.pdf; Created by: Karrer Zheng; Created Date: 6/8/2015; Capacitance: 1200 μF; Application: Medium and high voltage type range from 160V-450V used as primary side input filter in power supply; Low voltage type used as energy storage or low frequency filtering in circuit, applied to general switching power supply, AC-DC converter, adapter, charger, TV, VCR, DC motor circuit filter, digital audio, digital cameras, digital video cameras, satellite receiver etc.
footprint WCAP-ATG8 13x20x5x0.6
pins: 1, 2

## WCAP-ATG8 13x25x5x0.6 860010578019
designator C?, comment 1500 μF
WCAP-ATG8 Aluminum Electrolytic Capacitors , 1500 μF; + / - 20%; 35 V , 13 x 25; Manufacturer: Wurth Elektronik; partNo: 860010578019; E-mail: libraries@we-online.com; Characteristics: Aluminum Electrolytic Capacitor; Recommended soldering: Wave; Operating temperature:–40 °C to +85 °C for UR < 400 V; 25 °C to +85 °C for UR ≥ 400 V; Wide capacitance value range; Load life: 2000 h @ +85 °C; ComponentLink1Description: Manufacturer; ComponentLink1URL: http://www.we-online.com; ComponentLink2Description: Datasheet; ComponentLink2URL: http://katalog.we-online.de/pbs/datasheet/860010578019.pdf; Created by: Karrer Zheng; Created Date: 6/8/2015; Capacitance: 1500 μF; Application: Medium and high voltage type range from 160V-450V used as primary side input filter in power supply; Low voltage type used as energy storage or low frequency filtering in circuit, applied to general switching power supply, AC-DC converter, adapter, charger, TV, VCR, DC motor circuit filter, digital audio, digital cameras, digital video cameras, satellite receiver etc.
footprint WCAP-ATG8 13x25x5x0.6
pins: 1, 2

## WCAP-ATG8 16x25x7.5x0.8 860010580020
designator C?, comment 1800 μF
WCAP-ATG8 Aluminum Electrolytic Capacitors , 1800 μF; + / - 20%; 35 V , 16 x 25; Manufacturer: Wurth Elektronik; partNo: 860010580020; E-mail: libraries@we-online.com; Characteristics: Aluminum Electrolytic Capacitor; Recommended soldering: Wave; Operating temperature:–40 °C to +85 °C for UR < 400 V; 25 °C to +85 °C for UR ≥ 400 V; Wide capacitance value range; Load life: 2000 h @ +85 °C; ComponentLink1Description: Manufacturer; ComponentLink1URL: http://www.we-online.com; ComponentLink2Description: Datasheet; ComponentLink2URL: http://katalog.we-online.de/pbs/datasheet/860010580020.pdf; Created by: Karrer Zheng; Created Date: 6/8/2015; Capacitance: 1800 μF; Application: Medium and high voltage type range from 160V-450V used as primary side input filter in power supply; Low voltage type used as energy storage or low frequency filtering in circuit, applied to general switching power supply, AC-DC converter, adapter, charger, TV, VCR, DC motor circuit filter, digital audio, digital cameras, digital video cameras, satellite receiver etc.
footprint WCAP-ATG8 16x25x7.5x0.8
pins: 1, 2

## WCAP-ATG8 16x25x7.5x0.8 860010580021
designator C?, comment 2200 μF
WCAP-ATG8 Aluminum Electrolytic Capacitors , 2200 μF; + / - 20%; 35 V , 16 x 25; Manufacturer: Wurth Elektronik; partNo: 860010580021; E-mail: libraries@we-online.com; Characteristics: Aluminum Electrolytic Capacitor; Recommended soldering: Wave; Operating temperature:–40 °C to +85 °C for UR < 400 V; 25 °C to +85 °C for UR ≥ 400 V; Wide capacitance value range; Load life: 2000 h @ +85 °C; ComponentLink1Description: Manufacturer; ComponentLink1URL: http://www.we-online.com; ComponentLink2Description: Datasheet; ComponentLink2URL: http://katalog.we-online.de/pbs/datasheet/860010580021.pdf; Created by: Karrer Zheng; Created Date: 6/8/2015; Capacitance: 2200 μF; Application: Medium and high voltage type range from 160V-450V used as primary side input filter in power supply; Low voltage type used as energy storage or low frequency filtering in circuit, applied to general switching power supply, AC-DC converter, adapter, charger, TV, VCR, DC motor circuit filter, digital audio, digital cameras, digital video cameras, satellite receiver etc.
footprint WCAP-ATG8 16x25x7.5x0.8
pins: 1, 2

## WCAP-ATG8 16x31.5x7.5x0.8 860010580022
designator C?, comment 2700 μF
WCAP-ATG8 Aluminum Electrolytic Capacitors , 2700 μF; + / - 20%; 35 V , 16 x 31,5; Manufacturer: Wurth Elektronik; partNo: 860010580022; E-mail: libraries@we-online.com; Characteristics: Aluminum Electrolytic Capacitor; Recommended soldering: Wave; Operating temperature:–40 °C to +85 °C for UR < 400 V; 25 °C to +85 °C for UR ≥ 400 V; Wide capacitance value range; Load life: 2000 h @ +85 °C; ComponentLink1Description: Manufacturer; ComponentLink1URL: http://www.we-online.com; ComponentLink2Description: Datasheet; ComponentLink2URL: http://katalog.we-online.de/pbs/datasheet/860010580022.pdf; Created by: Karrer Zheng; Created Date: 6/8/2015; Capacitance: 2700 μF; Application: Medium and high voltage type range from 160V-450V used as primary side input filter in power supply; Low voltage type used as energy storage or low frequency filtering in circuit, applied to general switching power supply, AC-DC converter, adapter, charger, TV, VCR, DC motor circuit filter, digital audio, digital cameras, digital video cameras, satellite receiver etc.
footprint WCAP-ATG8 16x31.5x7.5x0.8
pins: 1, 2

## WCAP-ATG8 16x31.5x7.5x0.8 860010580023
designator C?, comment 3300 μF
WCAP-ATG8 Aluminum Electrolytic Capacitors , 3300 μF; + / - 20%; 35 V , 16 x 31,5; Manufacturer: Wurth Elektronik; partNo: 860010580023; E-mail: libraries@we-online.com; Characteristics: Aluminum Electrolytic Capacitor; Recommended soldering: Wave; Operating temperature:–40 °C to +85 °C for UR < 400 V; 25 °C to +85 °C for UR ≥ 400 V; Wide capacitance value range; Load life: 2000 h @ +85 °C; ComponentLink1Description: Manufacturer; ComponentLink1URL: http://www.we-online.com; ComponentLink2Description: Datasheet; ComponentLink2URL: http://katalog.we-online.de/pbs/datasheet/860010580023.pdf; Created by: Karrer Zheng; Created Date: 6/8/2015; Capacitance: 3300 μF; Application: Medium and high voltage type range from 160V-450V used as primary side input filter in power supply; Low voltage type used as energy storage or low frequency filtering in circuit, applied to general switching power supply, AC-DC converter, adapter, charger, TV, VCR, DC motor circuit filter, digital audio, digital cameras, digital video cameras, satellite receiver etc.
footprint WCAP-ATG8 16x31.5x7.5x0.8
pins: 1, 2

## WCAP-ATG8 18x31.5x7.5x0.8 860010581024
designator C?, comment 3900 μF
WCAP-ATG8 Aluminum Electrolytic Capacitors , 3900 μF; + / - 20%; 35 V , 18 x 31,5; Manufacturer: Wurth Elektronik; partNo: 860010581024; E-mail: libraries@we-online.com; Characteristics: Aluminum Electrolytic Capacitor; Recommended soldering: Wave; Operating temperature:–40 °C to +85 °C for UR < 400 V; 25 °C to +85 °C for UR ≥ 400 V; Wide capacitance value range; Load life: 2000 h @ +85 °C; ComponentLink1Description: Manufacturer; ComponentLink1URL: http://www.we-online.com; ComponentLink2Description: Datasheet; ComponentLink2URL: http://katalog.we-online.de/pbs/datasheet/860010581024.pdf; Created by: Karrer Zheng; Created Date: 6/8/2015; Capacitance: 3900 μF; Application: Medium and high voltage type range from 160V-450V used as primary side input filter in power supply; Low voltage type used as energy storage or low frequency filtering in circuit, applied to general switching power supply, AC-DC converter, adapter, charger, TV, VCR, DC motor circuit filter, digital audio, digital cameras, digital video cameras, satellite receiver etc.
footprint WCAP-ATG8 18x31.5x7.5x0.8
pins: 1, 2

## WCAP-ATG8 18x35.5x7.5x0.8 860010581025
designator C?, comment 4700 μF
WCAP-ATG8 Aluminum Electrolytic Capacitors , 4700 μF; + / - 20%; 35 V , 18 x 35,5; Manufacturer: Wurth Elektronik; partNo: 860010581025; E-mail: libraries@we-online.com; Characteristics: Aluminum Electrolytic Capacitor; Recommended soldering: Wave; Operating temperature:–40 °C to +85 °C for UR < 400 V; 25 °C to +85 °C for UR ≥ 400 V; Wide capacitance value range; Load life: 2000 h @ +85 °C; ComponentLink1Description: Manufacturer; ComponentLink1URL: http://www.we-online.com; ComponentLink2Description: Datasheet; ComponentLink2URL: http://katalog.we-online.de/pbs/datasheet/860010581025.pdf; Created by: Karrer Zheng; Created Date: 6/8/2015; Capacitance: 4700 μF; Application: Medium and high voltage type range from 160V-450V used as primary side input filter in power supply; Low voltage type used as energy storage or low frequency filtering in circuit, applied to general switching power supply, AC-DC converter, adapter, charger, TV, VCR, DC motor circuit filter, digital audio, digital cameras, digital video cameras, satellite receiver etc.
footprint WCAP-ATG8 18x35.5x7.5x0.8
pins: 1, 2

## WCAP-ATG8 18x41x7.5x0.8 860010581026
designator C?, comment 5600 μF
WCAP-ATG8 Aluminum Electrolytic Capacitors , 5600 μF; + / - 20%; 35 V , 18 x 41; Manufacturer: Wurth Elektronik; partNo: 860010581026; E-mail: libraries@we-online.com; Characteristics: Aluminum Electrolytic Capacitor; Recommended soldering: Wave; Operating temperature:–40 °C to +85 °C for UR < 400 V; 25 °C to +85 °C for UR ≥ 400 V; Wide capacitance value range; Load life: 2000 h @ +85 °C; ComponentLink1Description: Manufacturer; ComponentLink1URL: http://www.we-online.com; ComponentLink2Description: Datasheet; ComponentLink2URL: http://katalog.we-online.de/pbs/datasheet/860010581026.pdf; Created by: Karrer Zheng; Created Date: 6/8/2015; Capacitance: 5600 μF; Application: Medium and high voltage type range from 160V-450V used as primary side input filter in power supply; Low voltage type used as energy storage or low frequency filtering in circuit, applied to general switching power supply, AC-DC converter, adapter, charger, TV, VCR, DC motor circuit filter, digital audio, digital cameras, digital video cameras, satellite receiver etc.
footprint WCAP-ATG8 18x41x7.5x0.8
pins: 1, 2

## WCAP-ATG8 22x41x10x0.8 860010583027
designator C?, comment 6800 μF
WCAP-ATG8 Aluminum Electrolytic Capacitors , 6800 μF; + / - 20%; 35 V , 22 x 41; Manufacturer: Wurth Elektronik; partNo: 860010583027; E-mail: libraries@we-online.com; Characteristics: Aluminum Electrolytic Capacitor; Recommended soldering: Wave; Operating temperature:–40 °C to +85 °C for UR < 400 V; 25 °C to +85 °C for UR ≥ 400 V; Wide capacitance value range; Load life: 2000 h @ +85 °C; ComponentLink1Description: Manufacturer; ComponentLink1URL: http://www.we-online.com; ComponentLink2Description: Datasheet; ComponentLink2URL: http://katalog.we-online.de/pbs/datasheet/860010583027.pdf; Created by: Karrer Zheng; Created Date: 6/8/2015; Capacitance: 6800 μF; Application: Medium and high voltage type range from 160V-450V used as primary side input filter in power supply; Low voltage type used as energy storage or low frequency filtering in circuit, applied to general switching power supply, AC-DC converter, adapter, charger, TV, VCR, DC motor circuit filter, digital audio, digital cameras, digital video cameras, satellite receiver etc.
footprint WCAP-ATG8 22x41x10x0.8
pins: 1, 2


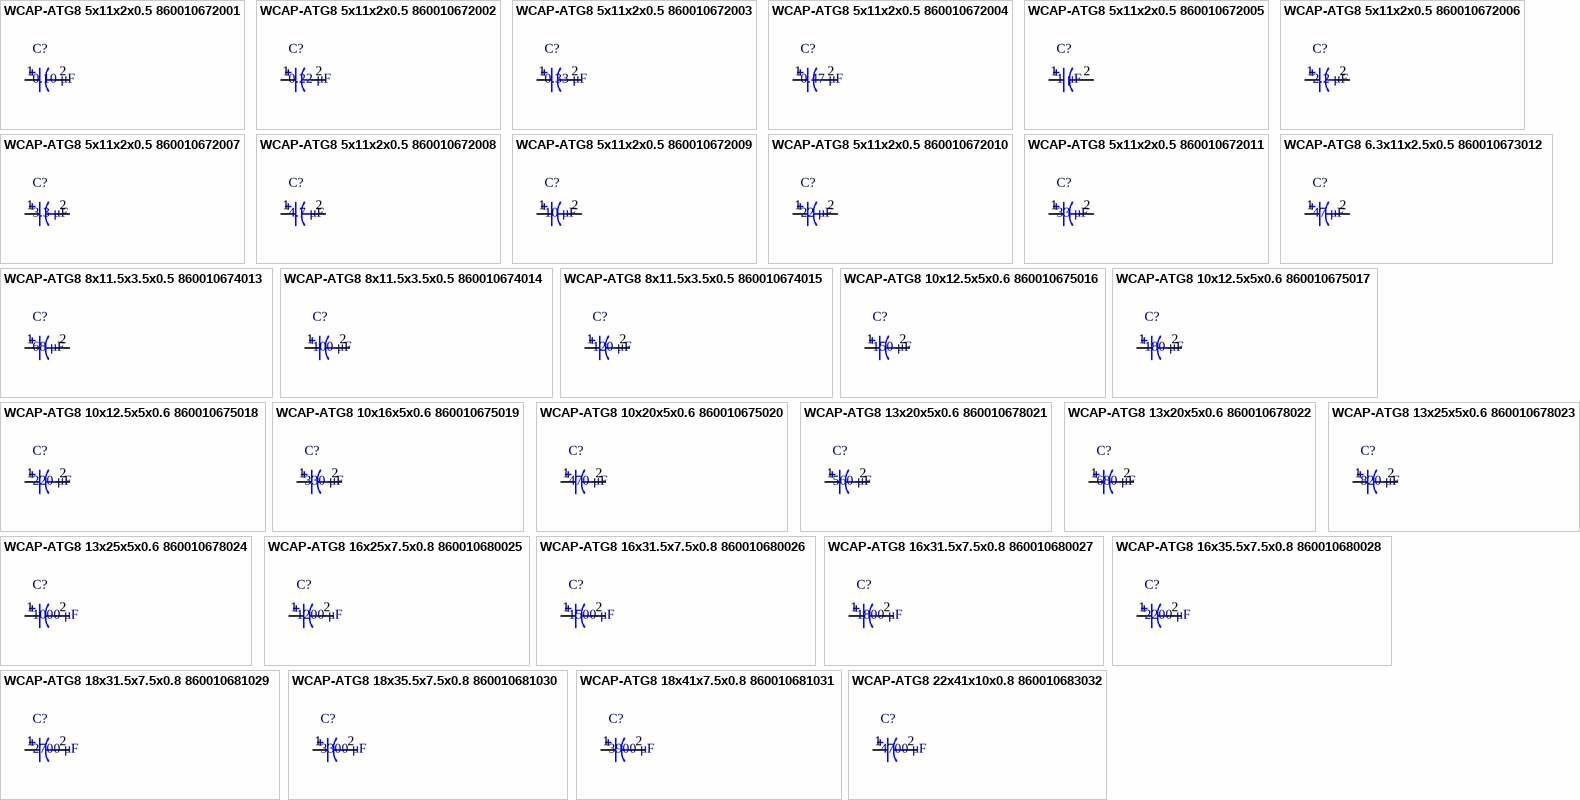
[diagram p3: symbols WCAP-ATG8 5x11x2x0.5 860010672001 to WCAP-ATG8 22x41x10x0.8 860010683032]

## WCAP-ATG8 5x11x2x0.5 860010672001
designator C?, comment 0.10 μF
WCAP-ATG8 Aluminum Electrolytic Capacitors , 0,10 μF; + / - 20%; 50 V , 5 x 11; Manufacturer: Wurth Elektronik; partNo: 860010672001; E-mail: libraries@we-online.com; Characteristics: Aluminum Electrolytic Capacitor; Recommended soldering: Wave; Operating temperature:–40 °C to +85 °C for UR < 400 V; 25 °C to +85 °C for UR ≥ 400 V; Wide capacitance value range; Load life: 2000 h @ +85 °C; ComponentLink1Description: Manufacturer; ComponentLink1URL: http://www.we-online.com; ComponentLink2Description: Datasheet; ComponentLink2URL: http://katalog.we-online.de/pbs/datasheet/860010672001.pdf; Created by: Karrer Zheng; Created Date: 6/8/2015; Capacitance: 0.10 μF; Application: Medium and high voltage type range from 160V-450V used as primary side input filter in power supply; Low voltage type used as energy storage or low frequency filtering in circuit, applied to general switching power supply, AC-DC converter, adapter, charger, TV, VCR, DC motor circuit filter, digital audio, digital cameras, digital video cameras, satellite receiver etc.
footprint WCAP-ATG8 5x11x2x0.5
pins: 1, 2

## WCAP-ATG8 5x11x2x0.5 860010672002
designator C?, comment 0.22 μF
WCAP-ATG8 Aluminum Electrolytic Capacitors , 0,22 μF; + / - 20%; 50 V , 5 x 11; Manufacturer: Wurth Elektronik; partNo: 860010672002; E-mail: libraries@we-online.com; Characteristics: Aluminum Electrolytic Capacitor; Recommended soldering: Wave; Operating temperature:–40 °C to +85 °C for UR < 400 V; 25 °C to +85 °C for UR ≥ 400 V; Wide capacitance value range; Load life: 2000 h @ +85 °C; ComponentLink1Description: Manufacturer; ComponentLink1URL: http://www.we-online.com; ComponentLink2Description: Datasheet; ComponentLink2URL: http://katalog.we-online.de/pbs/datasheet/860010672002.pdf; Created by: Karrer Zheng; Created Date: 6/8/2015; Capacitance: 0.22 μF; Application: Medium and high voltage type range from 160V-450V used as primary side input filter in power supply; Low voltage type used as energy storage or low frequency filtering in circuit, applied to general switching power supply, AC-DC converter, adapter, charger, TV, VCR, DC motor circuit filter, digital audio, digital cameras, digital video cameras, satellite receiver etc.
footprint WCAP-ATG8 5x11x2x0.5
pins: 1, 2

## WCAP-ATG8 5x11x2x0.5 860010672003
designator C?, comment 0.33 μF
WCAP-ATG8 Aluminum Electrolytic Capacitors , 0,33 μF; + / - 20%; 50 V , 5 x 11; Manufacturer: Wurth Elektronik; partNo: 860010672003; E-mail: libraries@we-online.com; Characteristics: Aluminum Electrolytic Capacitor; Recommended soldering: Wave; Operating temperature:–40 °C to +85 °C for UR < 400 V; 25 °C to +85 °C for UR ≥ 400 V; Wide capacitance value range; Load life: 2000 h @ +85 °C; ComponentLink1Description: Manufacturer; ComponentLink1URL: http://www.we-online.com; ComponentLink2Description: Datasheet; ComponentLink2URL: http://katalog.we-online.de/pbs/datasheet/860010672003.pdf; Created by: Karrer Zheng; Created Date: 6/8/2015; Capacitance: 0.33 μF; Application: Medium and high voltage type range from 160V-450V used as primary side input filter in power supply; Low voltage type used as energy storage or low frequency filtering in circuit, applied to general switching power supply, AC-DC converter, adapter, charger, TV, VCR, DC motor circuit filter, digital audio, digital cameras, digital video cameras, satellite receiver etc.
footprint WCAP-ATG8 5x11x2x0.5
pins: 1, 2

## WCAP-ATG8 5x11x2x0.5 860010672004
designator C?, comment 0.47 μF
WCAP-ATG8 Aluminum Electrolytic Capacitors , 0,47 μF; + / - 20%; 50 V , 5 x 11; Manufacturer: Wurth Elektronik; partNo: 860010672004; E-mail: libraries@we-online.com; Characteristics: Aluminum Electrolytic Capacitor; Recommended soldering: Wave; Operating temperature:–40 °C to +85 °C for UR < 400 V; 25 °C to +85 °C for UR ≥ 400 V; Wide capacitance value range; Load life: 2000 h @ +85 °C; ComponentLink1Description: Manufacturer; ComponentLink1URL: http://www.we-online.com; ComponentLink2Description: Datasheet; ComponentLink2URL: http://katalog.we-online.de/pbs/datasheet/860010672004.pdf; Created by: Karrer Zheng; Created Date: 6/8/2015; Capacitance: 0.47 μF; Application: Medium and high voltage type range from 160V-450V used as primary side input filter in power supply; Low voltage type used as energy storage or low frequency filtering in circuit, applied to general switching power supply, AC-DC converter, adapter, charger, TV, VCR, DC motor circuit filter, digital audio, digital cameras, digital video cameras, satellite receiver etc.
footprint WCAP-ATG8 5x11x2x0.5
pins: 1, 2

## WCAP-ATG8 5x11x2x0.5 860010672005
designator C?, comment 1 μF
WCAP-ATG8 Aluminum Electrolytic Capacitors , 1 μF; + / - 20%; 50 V , 5 x 11; Manufacturer: Wurth Elektronik; partNo: 860010672005; E-mail: libraries@we-online.com; Characteristics: Aluminum Electrolytic Capacitor; Recommended soldering: Wave; Operating temperature:–40 °C to +85 °C for UR < 400 V; 25 °C to +85 °C for UR ≥ 400 V; Wide capacitance value range; Load life: 2000 h @ +85 °C; ComponentLink1Description: Manufacturer; ComponentLink1URL: http://www.we-online.com; ComponentLink2Description: Datasheet; ComponentLink2URL: http://katalog.we-online.de/pbs/datasheet/860010672005.pdf; Created by: Karrer Zheng; Created Date: 6/8/2015; Capacitance: 1 μF; Application: Medium and high voltage type range from 160V-450V used as primary side input filter in power supply; Low voltage type used as energy storage or low frequency filtering in circuit, applied to general switching power supply, AC-DC converter, adapter, charger, TV, VCR, DC motor circuit filter, digital audio, digital cameras, digital video cameras, satellite receiver etc.
footprint WCAP-ATG8 5x11x2x0.5
pins: 1, 2

## WCAP-ATG8 5x11x2x0.5 860010672006
designator C?, comment 2.2 μF
WCAP-ATG8 Aluminum Electrolytic Capacitors , 2,2 μF; + / - 20%; 50 V , 5 x 11; Manufacturer: Wurth Elektronik; partNo: 860010672006; E-mail: libraries@we-online.com; Characteristics: Aluminum Electrolytic Capacitor; Recommended soldering: Wave; Operating temperature:–40 °C to +85 °C for UR < 400 V; 25 °C to +85 °C for UR ≥ 400 V; Wide capacitance value range; Load life: 2000 h @ +85 °C; ComponentLink1Description: Manufacturer; ComponentLink1URL: http://www.we-online.com; ComponentLink2Description: Datasheet; ComponentLink2URL: http://katalog.we-online.de/pbs/datasheet/860010672006.pdf; Created by: Karrer Zheng; Created Date: 6/8/2015; Capacitance: 2.2 μF; Application: Medium and high voltage type range from 160V-450V used as primary side input filter in power supply; Low voltage type used as energy storage or low frequency filtering in circuit, applied to general switching power supply, AC-DC converter, adapter, charger, TV, VCR, DC motor circuit filter, digital audio, digital cameras, digital video cameras, satellite receiver etc.
footprint WCAP-ATG8 5x11x2x0.5
pins: 1, 2